# Altium schematic symbol library microbuilder.SCHLIB: 530 symbols (part 2 of 7) (continued)
## EEPROM_SPI_AT25040ATSSOP (continued)
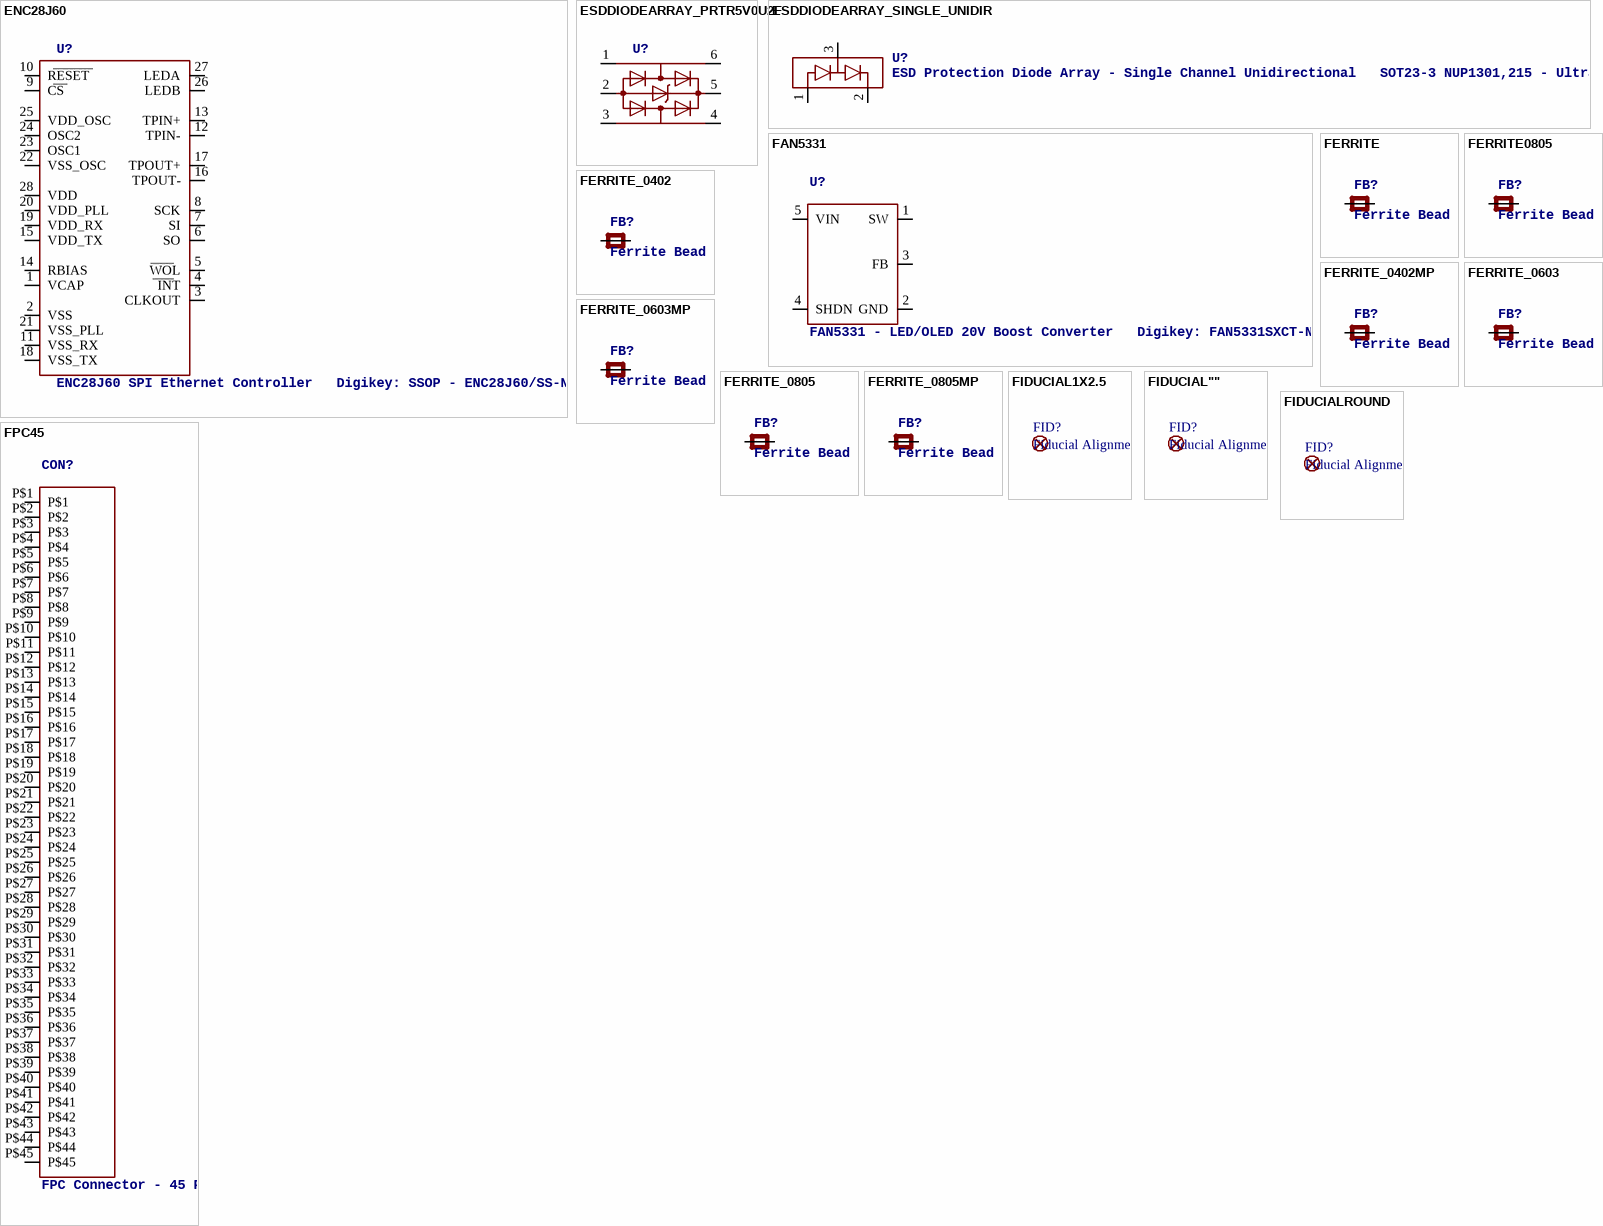
[diagram p13: symbols ENC28J60 to FPC45]

## ENC28J60
designator U?, comment ENC28J60 SPI Ethernet Controller   Digikey: SSOP - ENC28J60/SS-ND
footprint SSOP28DB
pins: 1 VCAP, 2 VSS, 3 CLKOUT, 4 INT, 5 WOL, 6 SO, 7 SI, 8 SCK, 9 CS, 10 RESET, 11 VSS_RX, 12 TPIN-, 13 TPIN+, 14 RBIAS, 15 VDD_TX, 16 TPOUT-, 17 TPOUT+, 18 VSS_TX, 19 VDD_RX, 20 VDD_PLL, 21 VSS_PLL, 22 VSS_OSC, 23 OSC1, 24 OSC2, 25 VDD_OSC, 26 LEDB, 27 LEDA, 28 VDD

## ESDDIODEARRAY_PRTR5V0U2F
designator U?
footprint SOT886
pins: 1 I/O1_1, 2 GND, 3 I/O2_1, 4 I/O2_2, 5 VBUS, 6 I/O1_2

## ESDDIODEARRAY_SINGLE_UNIDIR
designator U?, comment ESD Protection Diode Array - Single Channel Unidirectional   SOT23-3 NUP1301,215 - Ultra low capacitance (0.6pF), Rev Voltage 80V, Forward Current: 215mA - Digikey: 568-6351-1-ND
footprint SOT23-WIDE
pins: 1 GNDPIN (power), 2 SUPPLYPIN (power), 3 IO

## FAN5331
designator U?, comment FAN5331 - LED/OLED 20V Boost Converter   Digikey: FAN5331SXCT-ND
footprint SOT23-5
pins: 1 SW, 2 GND, 3 FB, 4 SHDN, 5 VIN

## FERRITE
designator FB?, comment Ferrite Bead   0603 MMZ1608B121C - 120 Ohm @ 100MHz, 600mA, 0.15 Ohm DC Resistance - Digikey: 445-2164-1-ND  BK1608HW121-T - 120 Ohm, 600mA Ferrite Chip - Digikey: 587-1876-2-ND       0805 HZ0805B272R-10 - 2.7K Ohm @ 100MHz, 200mA, 0.8 Ohm DC Resistance - Digikey: 240-2504-1-ND (see also Murata BLM21BD272SN1L)  MMZ2012Y152B - 1.5K Ohm @ 100MHz, 500mA, 0.4 Ohm DC Resistance - Digikey: 445-1560-1-ND - Mainly for high frequency (80-400MHz)  MMZ2012R102A - 1K Ohm @ 100MHz, 500mA, 0.3 Ohm DC Resistance - Digikey: 445-1555-2-ND - More general purpose (10-200MHz)
footprint 0603
pins: 1 P$1, 2 P$2

## FERRITE0805
designator FB?, comment Ferrite Bead   0603 MMZ1608B121C - 120 Ohm @ 100MHz, 600mA, 0.15 Ohm DC Resistance - Digikey: 445-2164-1-ND  BK1608HW121-T - 120 Ohm, 600mA Ferrite Chip - Digikey: 587-1876-2-ND       0805 HZ0805B272R-10 - 2.7K Ohm @ 100MHz, 200mA, 0.8 Ohm DC Resistance - Digikey: 240-2504-1-ND (see also Murata BLM21BD272SN1L)  MMZ2012Y152B - 1.5K Ohm @ 100MHz, 500mA, 0.4 Ohm DC Resistance - Digikey: 445-1560-1-ND - Mainly for high frequency (80-400MHz)  MMZ2012R102A - 1K Ohm @ 100MHz, 500mA, 0.3 Ohm DC Resistance - Digikey: 445-1555-2-ND - More general purpose (10-200MHz)
footprint 0805
pins: 1 P$1, 2 P$2

## FERRITE_0402
designator FB?, comment Ferrite Bead   0603 MMZ1608B121C - 120 Ohm @ 100MHz, 600mA, 0.15 Ohm DC Resistance - Digikey: 445-2164-1-ND  BK1608HW121-T - 120 Ohm, 600mA Ferrite Chip - Digikey: 587-1876-2-ND       0805 HZ0805B272R-10 - 2.7K Ohm @ 100MHz, 200mA, 0.8 Ohm DC Resistance - Digikey: 240-2504-1-ND (see also Murata BLM21BD272SN1L)  MMZ2012Y152B - 1.5K Ohm @ 100MHz, 500mA, 0.4 Ohm DC Resistance - Digikey: 445-1560-1-ND - Mainly for high frequency (80-400MHz)  MMZ2012R102A - 1K Ohm @ 100MHz, 500mA, 0.3 Ohm DC Resistance - Digikey: 445-1555-2-ND - More general purpose (10-200MHz)
footprint _0402
pins: 1 P$1, 2 P$2

## FERRITE_0402MP
designator FB?, comment Ferrite Bead   0603 MMZ1608B121C - 120 Ohm @ 100MHz, 600mA, 0.15 Ohm DC Resistance - Digikey: 445-2164-1-ND  BK1608HW121-T - 120 Ohm, 600mA Ferrite Chip - Digikey: 587-1876-2-ND       0805 HZ0805B272R-10 - 2.7K Ohm @ 100MHz, 200mA, 0.8 Ohm DC Resistance - Digikey: 240-2504-1-ND (see also Murata BLM21BD272SN1L)  MMZ2012Y152B - 1.5K Ohm @ 100MHz, 500mA, 0.4 Ohm DC Resistance - Digikey: 445-1560-1-ND - Mainly for high frequency (80-400MHz)  MMZ2012R102A - 1K Ohm @ 100MHz, 500mA, 0.3 Ohm DC Resistance - Digikey: 445-1555-2-ND - More general purpose (10-200MHz)
footprint _0402MP
pins: 1 P$1, 2 P$2

## FERRITE_0603
designator FB?, comment Ferrite Bead   0603 MMZ1608B121C - 120 Ohm @ 100MHz, 600mA, 0.15 Ohm DC Resistance - Digikey: 445-2164-1-ND  BK1608HW121-T - 120 Ohm, 600mA Ferrite Chip - Digikey: 587-1876-2-ND       0805 HZ0805B272R-10 - 2.7K Ohm @ 100MHz, 200mA, 0.8 Ohm DC Resistance - Digikey: 240-2504-1-ND (see also Murata BLM21BD272SN1L)  MMZ2012Y152B - 1.5K Ohm @ 100MHz, 500mA, 0.4 Ohm DC Resistance - Digikey: 445-1560-1-ND - Mainly for high frequency (80-400MHz)  MMZ2012R102A - 1K Ohm @ 100MHz, 500mA, 0.3 Ohm DC Resistance - Digikey: 445-1555-2-ND - More general purpose (10-200MHz)
footprint _0603
pins: 1 P$1, 2 P$2

## FERRITE_0603MP
designator FB?, comment Ferrite Bead   0603 MMZ1608B121C - 120 Ohm @ 100MHz, 600mA, 0.15 Ohm DC Resistance - Digikey: 445-2164-1-ND  BK1608HW121-T - 120 Ohm, 600mA Ferrite Chip - Digikey: 587-1876-2-ND       0805 HZ0805B272R-10 - 2.7K Ohm @ 100MHz, 200mA, 0.8 Ohm DC Resistance - Digikey: 240-2504-1-ND (see also Murata BLM21BD272SN1L)  MMZ2012Y152B - 1.5K Ohm @ 100MHz, 500mA, 0.4 Ohm DC Resistance - Digikey: 445-1560-1-ND - Mainly for high frequency (80-400MHz)  MMZ2012R102A - 1K Ohm @ 100MHz, 500mA, 0.3 Ohm DC Resistance - Digikey: 445-1555-2-ND - More general purpose (10-200MHz)
footprint _0603MP
pins: 1 P$1, 2 P$2

## FERRITE_0805
designator FB?, comment Ferrite Bead   0603 MMZ1608B121C - 120 Ohm @ 100MHz, 600mA, 0.15 Ohm DC Resistance - Digikey: 445-2164-1-ND  BK1608HW121-T - 120 Ohm, 600mA Ferrite Chip - Digikey: 587-1876-2-ND       0805 HZ0805B272R-10 - 2.7K Ohm @ 100MHz, 200mA, 0.8 Ohm DC Resistance - Digikey: 240-2504-1-ND (see also Murata BLM21BD272SN1L)  MMZ2012Y152B - 1.5K Ohm @ 100MHz, 500mA, 0.4 Ohm DC Resistance - Digikey: 445-1560-1-ND - Mainly for high frequency (80-400MHz)  MMZ2012R102A - 1K Ohm @ 100MHz, 500mA, 0.3 Ohm DC Resistance - Digikey: 445-1555-2-ND - More general purpose (10-200MHz)
footprint _0805
pins: 1 P$1, 2 P$2

## FERRITE_0805MP
designator FB?, comment Ferrite Bead   0603 MMZ1608B121C - 120 Ohm @ 100MHz, 600mA, 0.15 Ohm DC Resistance - Digikey: 445-2164-1-ND  BK1608HW121-T - 120 Ohm, 600mA Ferrite Chip - Digikey: 587-1876-2-ND       0805 HZ0805B272R-10 - 2.7K Ohm @ 100MHz, 200mA, 0.8 Ohm DC Resistance - Digikey: 240-2504-1-ND (see also Murata BLM21BD272SN1L)  MMZ2012Y152B - 1.5K Ohm @ 100MHz, 500mA, 0.4 Ohm DC Resistance - Digikey: 445-1560-1-ND - Mainly for high frequency (80-400MHz)  MMZ2012R102A - 1K Ohm @ 100MHz, 500mA, 0.3 Ohm DC Resistance - Digikey: 445-1555-2-ND - More general purpose (10-200MHz)
footprint _0805MP
pins: 1 P$1, 2 P$2

## FIDUCIAL1X2.5
designator FID?, comment Fiducial Alignment Points   Various fiducial points for machine vision alignment.
BOM: EXCLUDE
footprint FIDUCIAL-1X2.5

## FIDUCIAL""
designator FID?, comment Fiducial Alignment Points   Various fiducial points for machine vision alignment.
footprint FIDUCIAL_1MM

## FIDUCIALROUND
designator FID?, comment Fiducial Alignment Points   Various fiducial points for machine vision alignment.
footprint PASS-ROUND

## FPC45
designator CON?, comment FPC Connector - 45 Pin 0.5mm Bottom Contacts   Digikey: 609-1196-1-ND
footprint FPC45PIN
pins: P$1, P$2, P$3, P$4, P$5, P$6, P$7, P$8, P$9, P$10, P$11, P$12, P$13, P$14, P$15, P$16, P$17, P$18, P$19, P$20, P$21, P$22, P$23, P$24, P$25, P$26, P$27, P$28, P$29, P$30, P$31, P$32, P$33, P$34, P$35, P$36, P$37, P$38, P$39, P$40, P$41, P$42, P$43, P$44, P$45

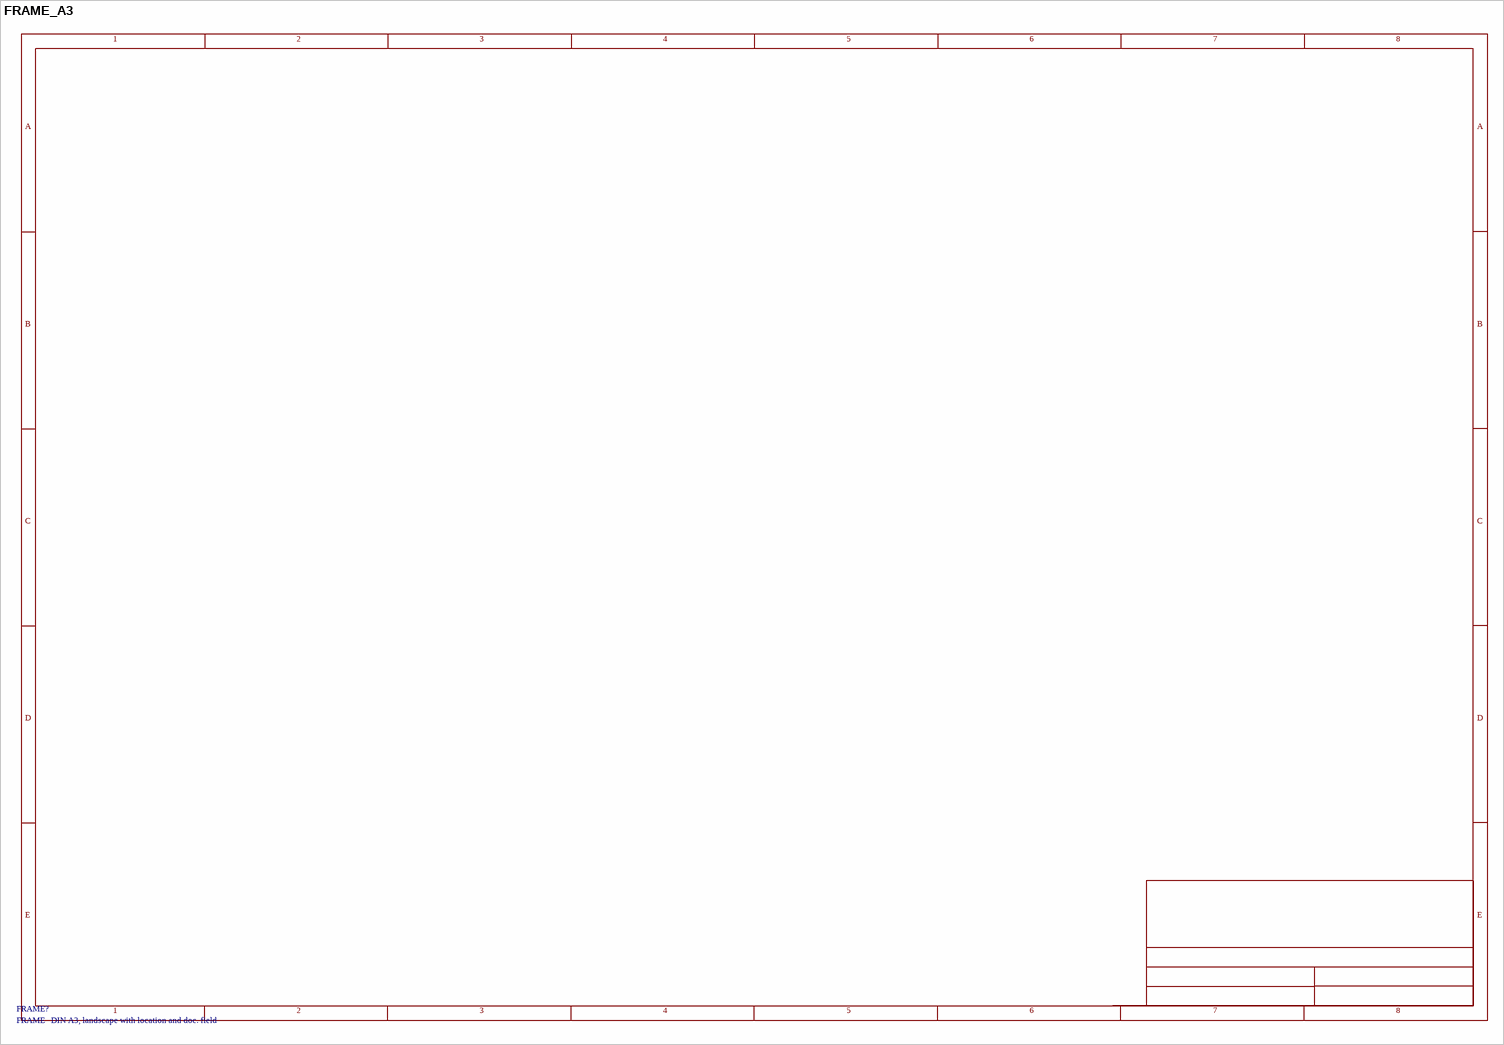
[diagram p14: symbol FRAME_A3]

## FRAME_A3
designator FRAME?, comment FRAME   DIN A3, landscape with location and doc. field
text: 1; 2; 3; 4; 5; 6; 7; 8; A; B; C; D; E

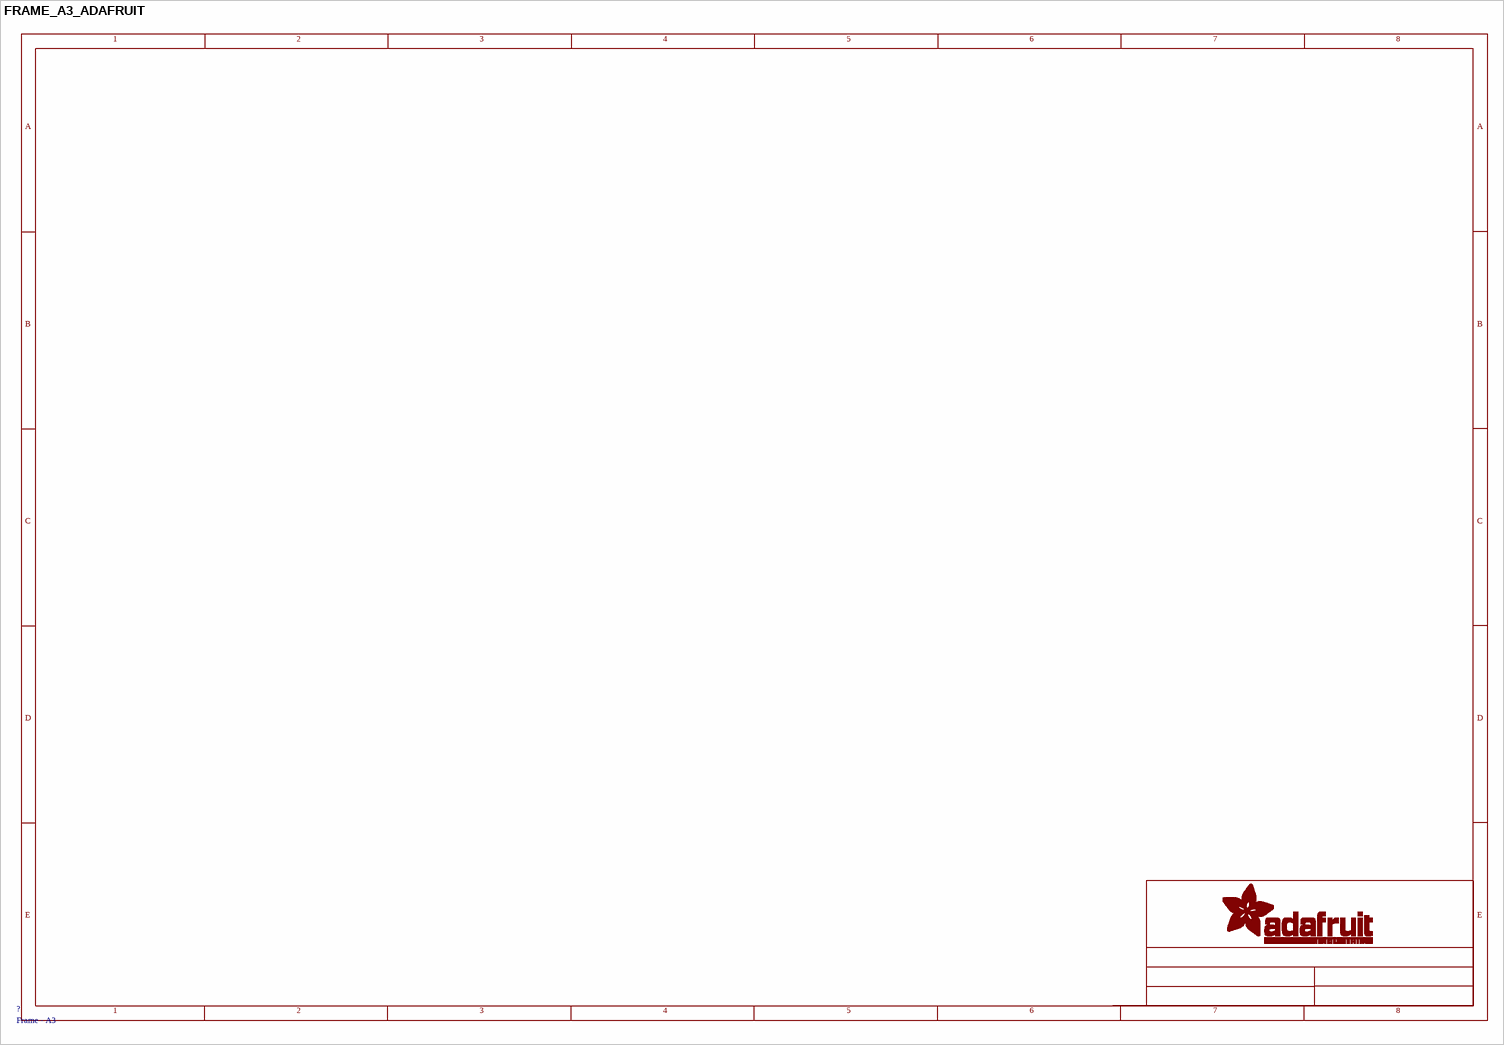
[diagram p15: symbol FRAME_A3_ADAFRUIT]

## FRAME_A3_ADAFRUIT
designator ?, comment Frame - A3
text: 1; 2; 3; 4; 5; 6; 7; 8; A; B; C; D; E

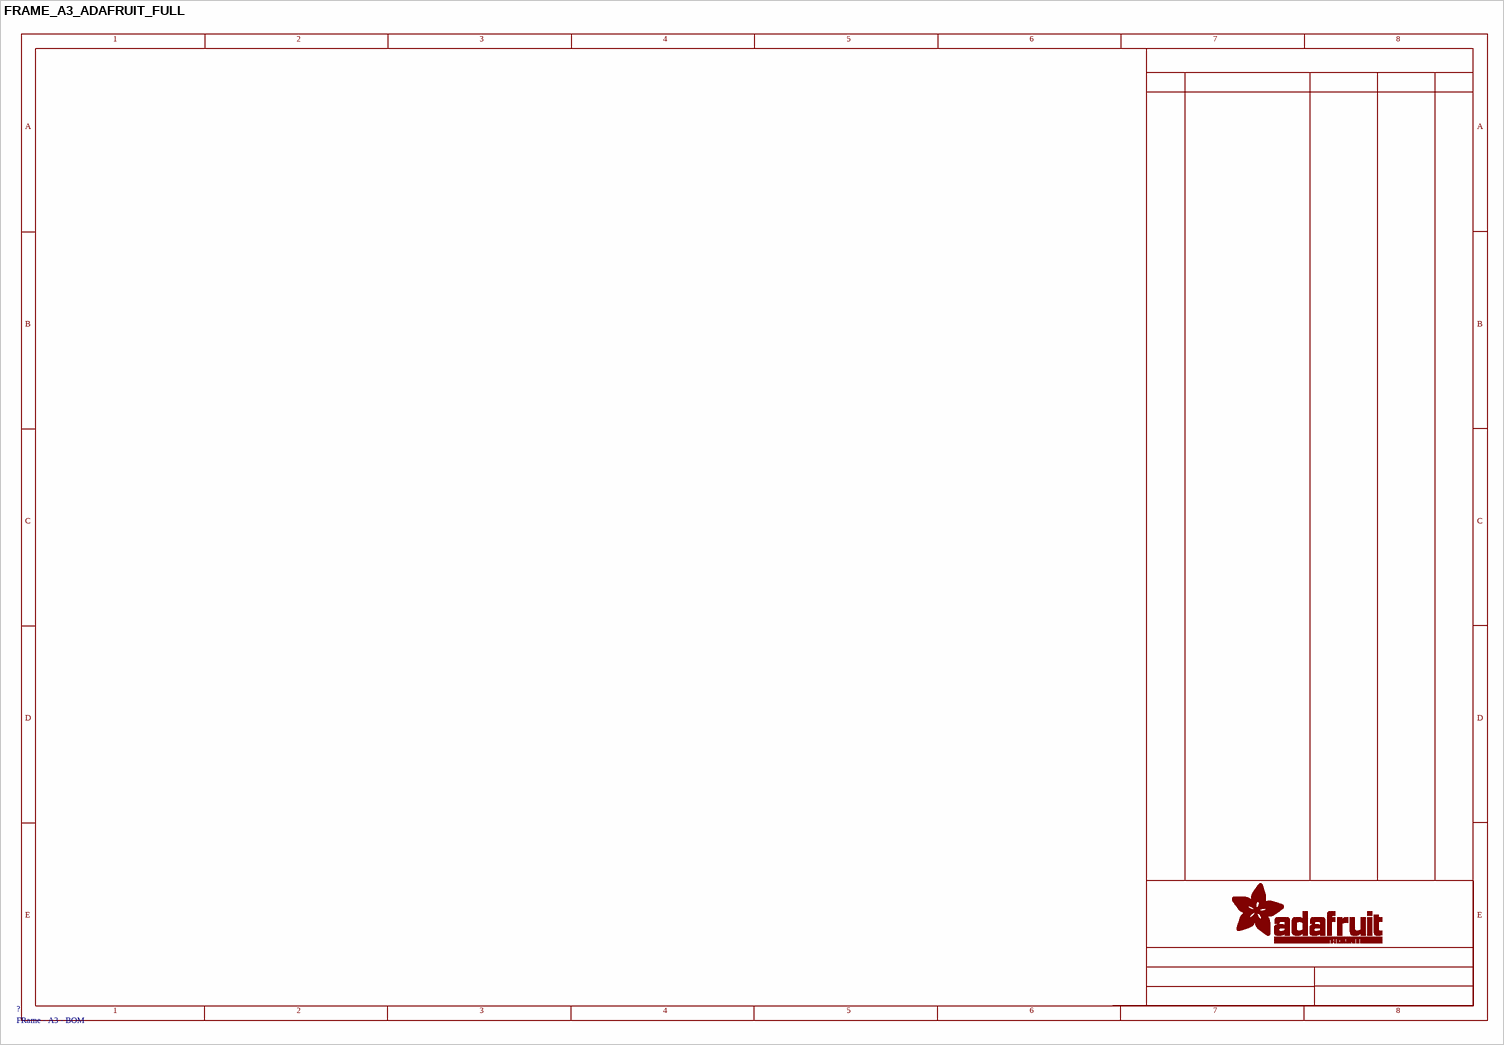
[diagram p16: symbol FRAME_A3_ADAFRUIT_FULL]

## FRAME_A3_ADAFRUIT_FULL
designator ?, comment FRame - A3 - BOM
text: 1; 2; 3; 4; 5; 6; 7; 8; A; B; C; D; E

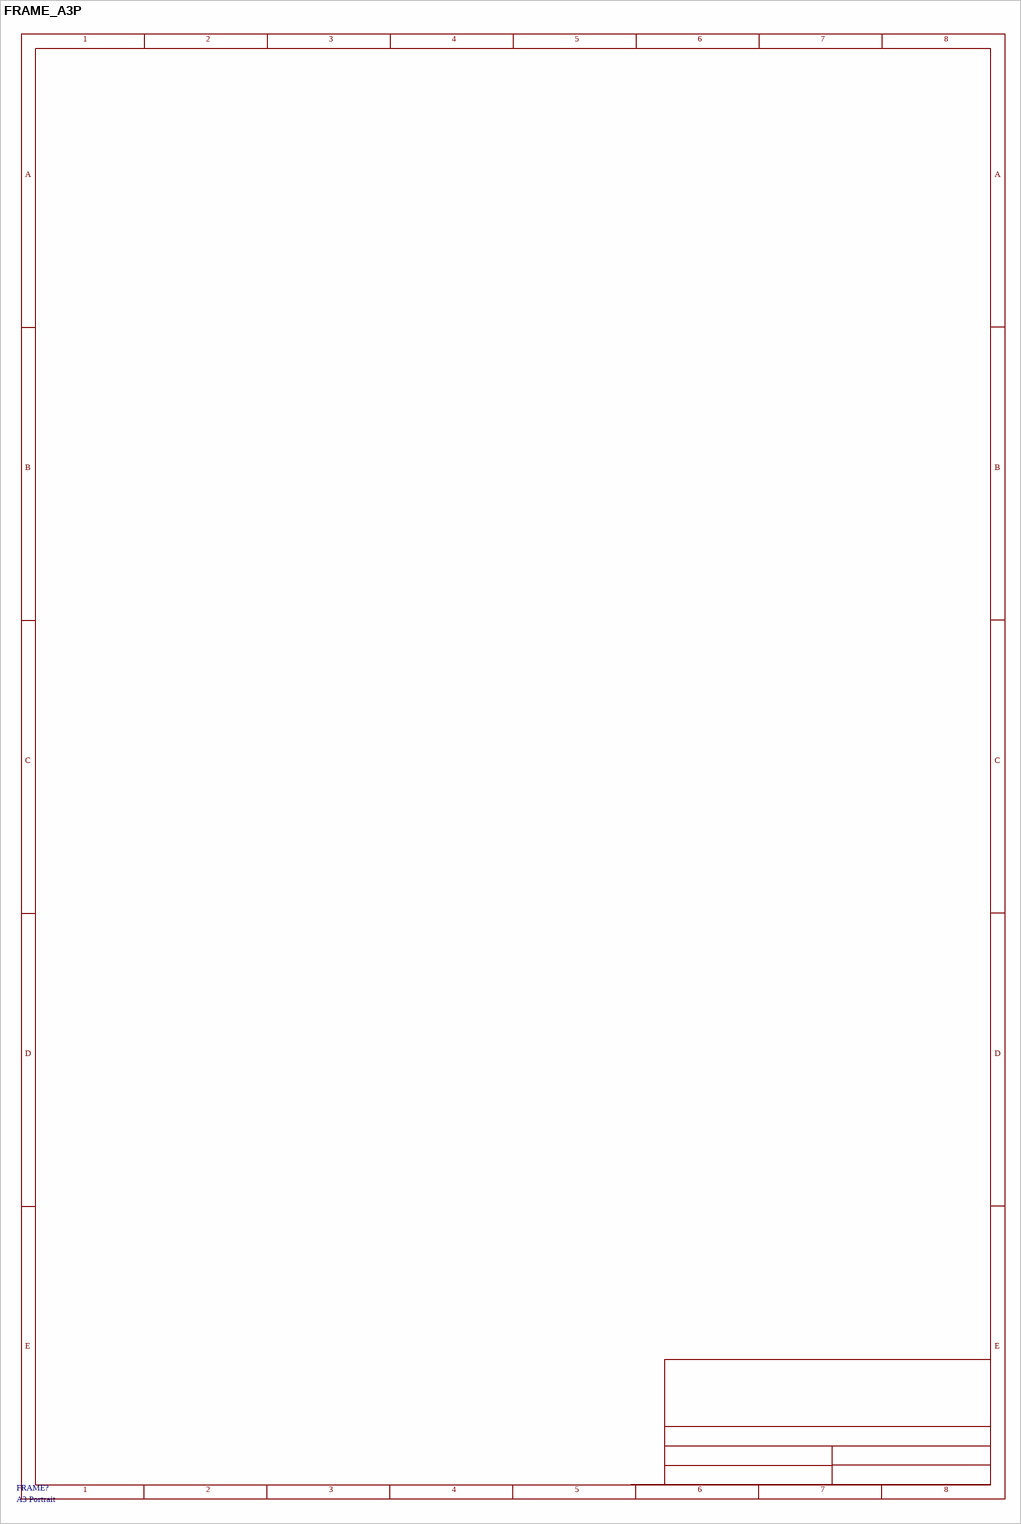
[diagram p17: symbol FRAME_A3P]

## FRAME_A3P
designator FRAME?, comment A3 Portrait
text: 1; 2; 3; 4; 5; 6; 7; 8; A; B; C; D; E

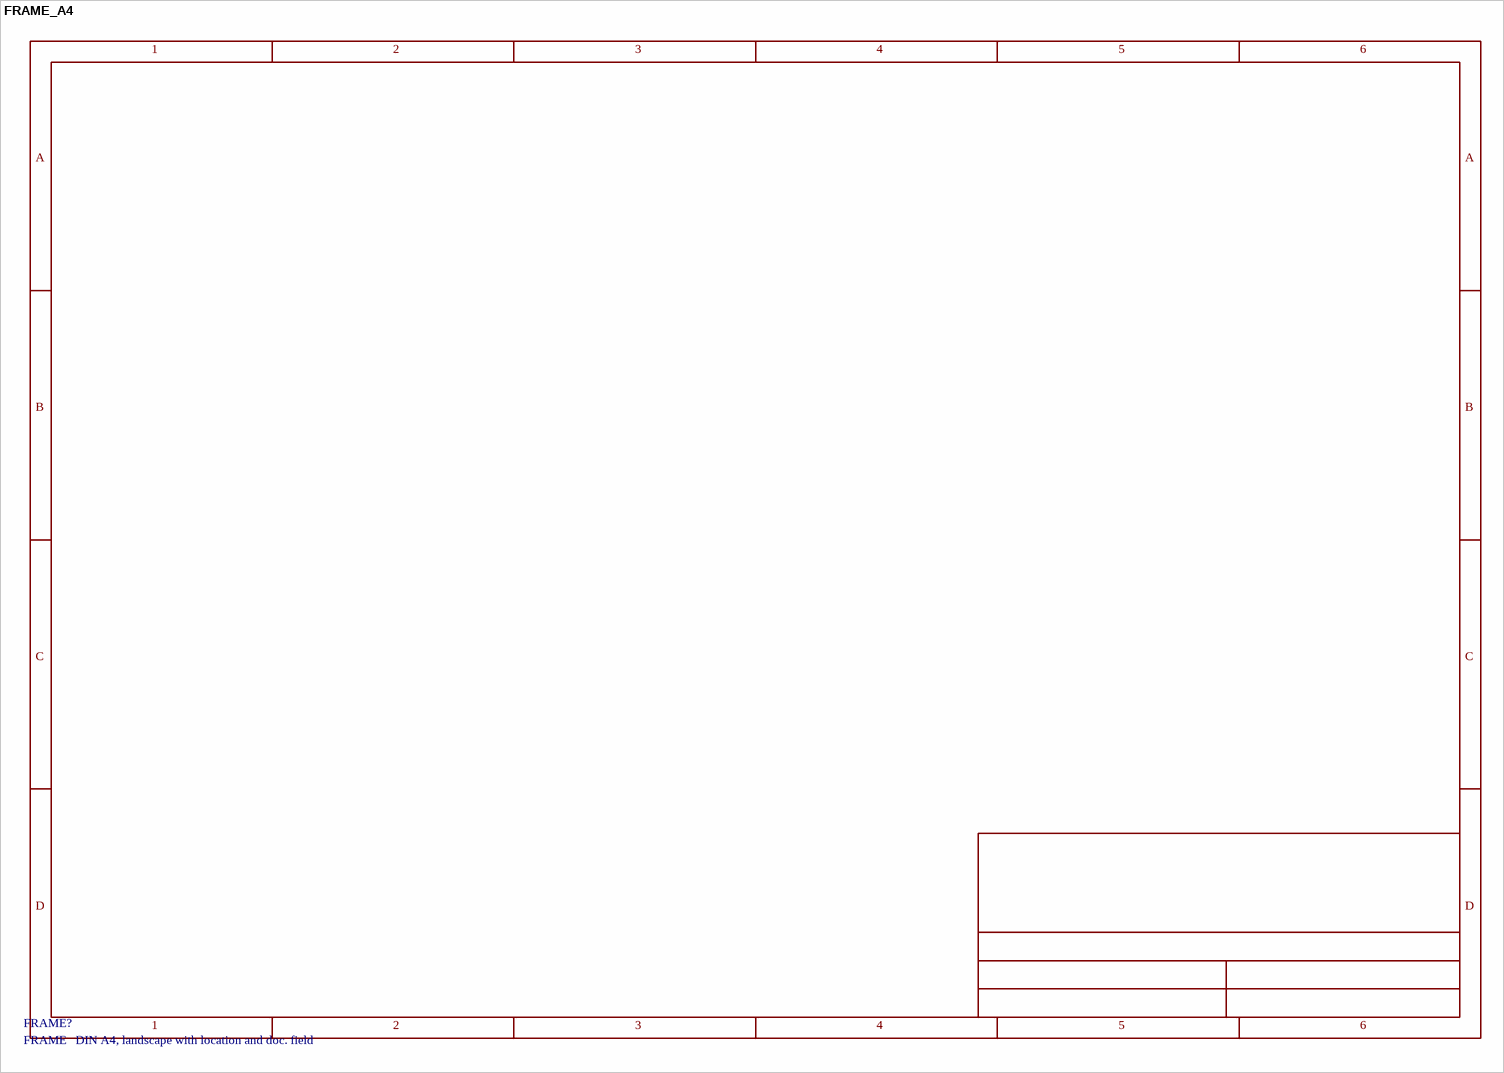
[diagram p18: symbol FRAME_A4]

## FRAME_A4
designator FRAME?, comment FRAME   DIN A4, landscape with location and doc. field
text: 1; 2; 3; 4; 5; 6; A; B; C; D

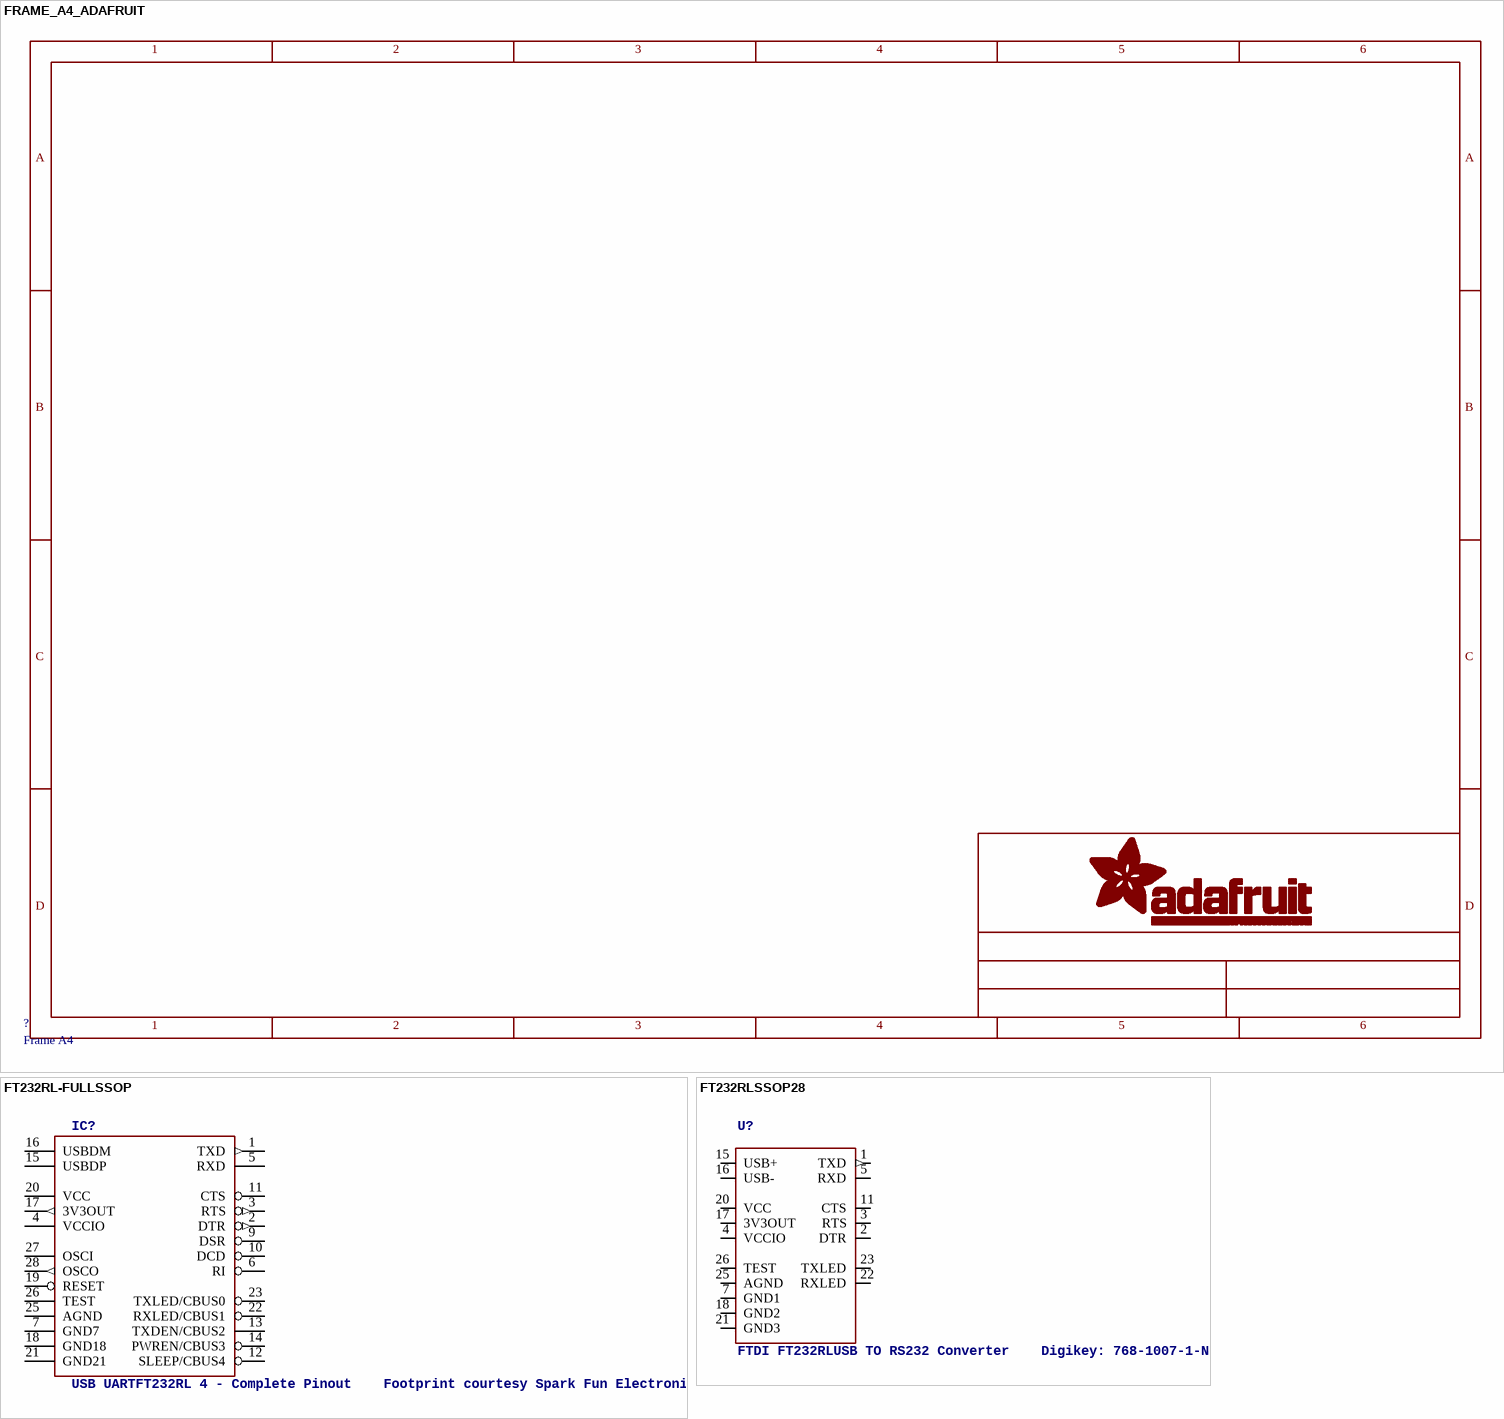
[diagram p19: symbols FRAME_A4_ADAFRUIT to FT232RLSSOP28]

## FRAME_A4_ADAFRUIT
designator ?, comment Frame A4
text: 1; 2; 3; 4; 5; 6; A; B; C; D

## FT232RL-FULLSSOP
designator IC?, comment USB UARTFT232RL 4 - Complete Pinout    Footprint courtesy Spark Fun Electronics
footprint SSOP28DB
pins: 1 TXD (out), 2 DTR (out), 3 RTS (out), 4 VCCIO (power), 5 RXD, 6 RI, 7 GND7 (power), 9 DSR, 10 DCD, 11 CTS, 12 SLEEP/CBUS4, 13 TXDEN/CBUS2, 14 PWREN/CBUS3, 15 USBDP, 16 USBDM, 17 3V3OUT (out), 18 GND18 (power), 19 RESET, 20 VCC (power), 21 GND21 (power), 22 RXLED/CBUS1, 23 TXLED/CBUS0, 25 AGND (power), 26 TEST, 27 OSCI, 28 OSCO (out)

## FT232RLSSOP28
designator U?, comment FTDI FT232RLUSB TO RS232 Converter    Digikey: 768-1007-1-ND
footprint SSOP28DB
pins: 1 TXD (out), 2 DTR, 3 RTS, 4 VCCIO (power), 5 RXD, 7 GND1 (power), 11 CTS, 15 USB+, 16 USB-, 17 3V3OUT (power), 18 GND2 (power), 20 VCC (power), 21 GND3 (power), 22 RXLED, 23 TXLED, 25 AGND (power), 26 TEST

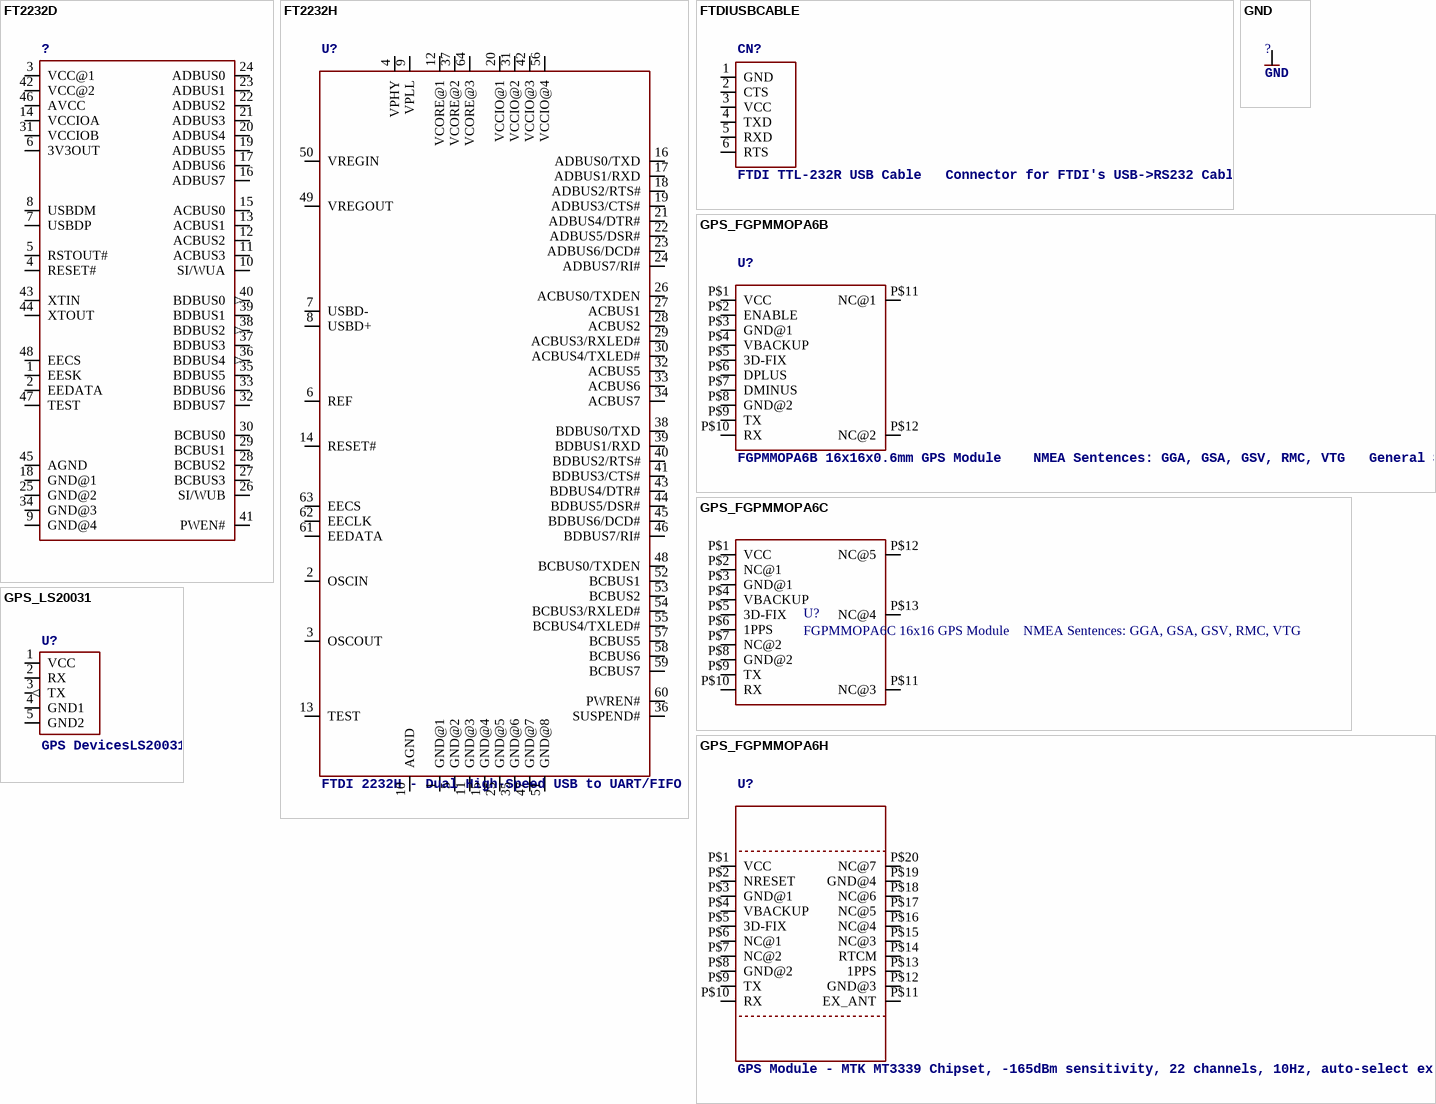
[diagram p20: symbols FT2232D to GPS_LS20031]

## FT2232D
designator ?
footprint LQFP48
pins: 1 EESK, 2 EEDATA, 3 VCC@1 (power), 4 RESET#, 5 RSTOUT#, 6 3V3OUT (power), 7 USBDP, 8 USBDM, 9 GND@4 (power), 10 SI/WUA, 11 ACBUS3, 12 ACBUS2, 13 ACBUS1, 14 VCCIOA (power), 15 ACBUS0, 16 ADBUS7, 17 ADBUS6, 18 GND@1 (power), 19 ADBUS5, 20 ADBUS4, 21 ADBUS3, 22 ADBUS2, 23 ADBUS1, 24 ADBUS0, 25 GND@2 (power), 26 SI/WUB, 27 BCBUS3, 28 BCBUS2, 29 BCBUS1, 30 BCBUS0, 31 VCCIOB (power), 32 BDBUS7, 33 BDBUS6, 34 GND@3 (power), 35 BDBUS5, 36 BDBUS4 (out), 37 BDBUS3, 38 BDBUS2 (out), 39 BDBUS1, 40 BDBUS0 (out), 41 PWEN#, 42 VCC@2 (power), 43 XTIN, 44 XTOUT, 45 AGND (power), 46 AVCC (power), 47 TEST, 48 EECS